# Altium footprint library Mainboard.PcbLib: 37 footprints (part 2 of 3)
Each footprint in its own frame and in the unit in brackets; x right, y up, seen from the top. Pads: shape width x height; smd on the part's side, far side on the other; paste and mask are expansions set on the pad; w line width, h text height; cw(c..) or ccw(c..) is an arc to the next point about the centre after c.
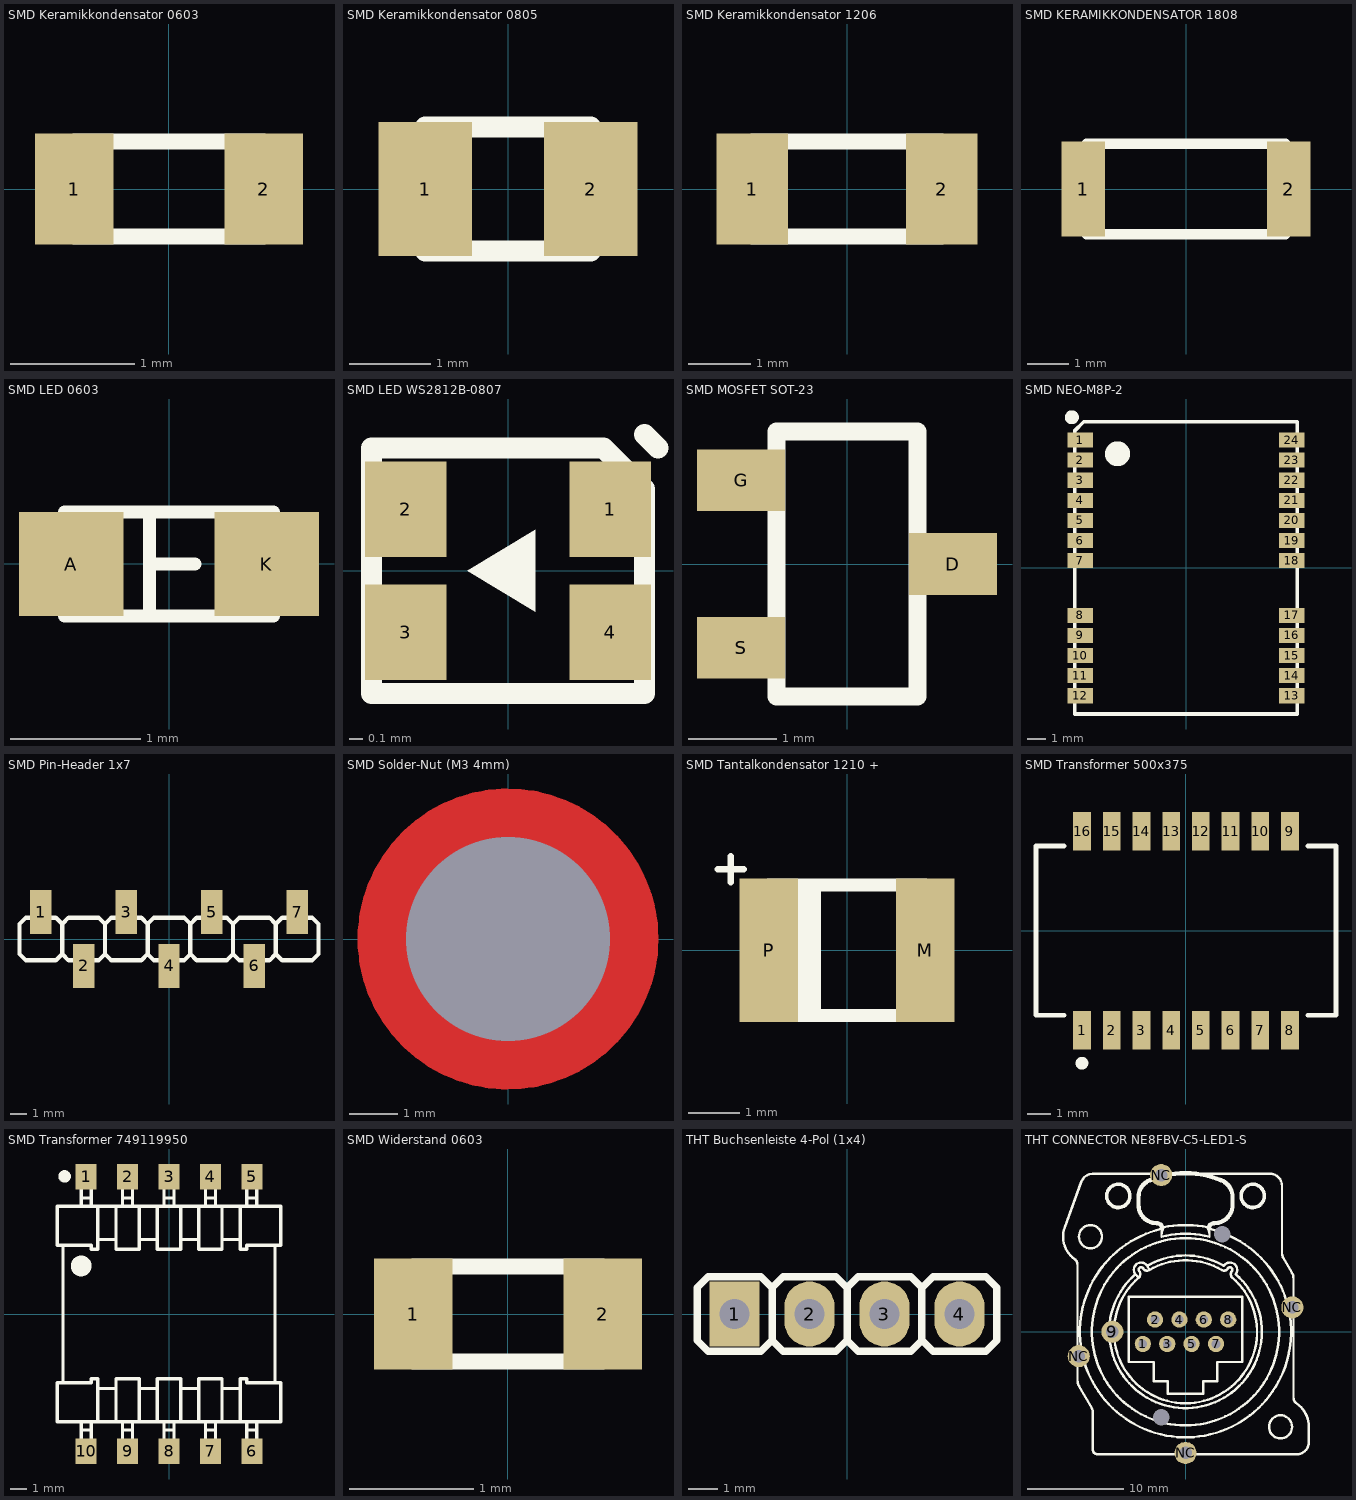
[diagram p1: the footprints below, top view; thin cyan lines are the x and y axes]

## SMD Keramikkondensator 0603 [mil]
height 66.93
pads (2):
  rect 25x35 smd: 1(-30,0) 2(30,0)
Top Overlay:
  lines w5: -30,-15 30,-15 30,15 -30,15 -30,-15
3D body "User Library-0603_Cap.STEP": height 31.69, standoff 0, extent -31.49,-15.74 31.5,15.75

## SMD Keramikkondensator 0805 [mil]
height 66.93
pads (2):
  rect 45x65 smd: 1(-40,0) 2(40,0)
Top Overlay:
  lines w10: -40,-30 -40,30 40,30 40,-30 -40,-30
3D body "User Library-0805 SMD Capacitor.step": height 30.79, standoff 0, extent -39.36,-24.6 39.38,24.61

## SMD Keramikkondensator 1206 [mil]
pads (2):
  rect 45x70 smd: 1(-60,0) 2(60,0)
Top Overlay:
  lines w10: -60,-30 -60,30 60,30 60,-30 -60,-30
3D body "User Library-1206 SMD Capacitor.step": height 39.45, standoff 0, extent -62.98,-31.49 63,31.51

## SMD KERAMIKKONDENSATOR 1808 [mm]
pads (2):
  rect 1.05x2.3 smd: 1(-2.5,0) 2(2.5,0)
Top Overlay:
  lines w0.254: -2.413,-1.1 -2.413,1.1 2.413,1.1 2.413,-1.1 -2.413,-1.1
3D body "User Library-Ceramic_Capacitor_1808_h50mil.STEP": height 1.26, standoff 0.01, extent -2.25,-1 2.25,1

## SMD LED 0603 [mm] "SMD_LED_RED"
height 8.65
pads (2):
  rect 0.8x0.8 smd: A(-0.75,0) K(0.75,0)
Top Overlay:
  lines w0.1: -0.15,-0.4 -0.15,0.4 ; -0.15,0 0.2,0 ; -0.8,-0.4 0.8,-0.4 0.8,0.4 -0.8,0.4 -0.8,-0.4
3D body "User Library-LED SMD0603.step": height 0.68, standoff 0, extent -0.808,-0.368 0.842,0.357

## SMD LED WS2812B-0807 [mm] "SMD_LED_RED"
height 8.65
pads (4):
  rect 0.6x0.7 smd: 1(0.75,0.45) 2(-0.75,0.45) 3(-0.75,-0.45) 4(0.75,-0.45)
Top Overlay:
  region: 0.2,0.3 -0.3,0 0.2,-0.3
  lines w0.152: 1,1 1.1,0.9 ; -1,-0.9 1,-0.9 1,0.6 0.7,0.9 -1,0.9 -1,-0.9
3D body "WS2812-0807.SLDPRT": height 0.85, standoff 0.01, extent -1,-0.9 1,0.9

## SMD MOSFET SOT-23 [mm]
pads (3):
  rect 1x0.7 smd: D(1.2,0) G(-1.2,0.95) S(-1.2,-0.95)
Top Overlay:
  lines w0.203: -0.8,-1.5 -0.8,1.5 0.8,1.5 0.8,-1.5 -0.8,-1.5
3D body "CircuitWorks-SOT-23.step": height 1.1, standoff 0, extent -1.301,-1.5 1.199,1.5

## SMD NEO-M8P-2 [mm] "QFN, 48-Leads, Body 7x7mm, Pitch 0.5mm, IPC Medium Density"
height 0.9
pads (24):
  rect 1.4x0.825 smd: 1(-5.8,7) 2(-5.8,5.9) 3(-5.8,4.8) 4(-5.8,3.7) 5(-5.8,2.6) 6(-5.8,1.5) 7(-5.8,0.4) 8(-5.8,-2.6) 9(-5.8,-3.7) 10(-5.8,-4.8) 11(-5.8,-5.9) 12(-5.8,-7) 13(5.8,-7) 14(5.8,-5.9) 15(5.8,-4.8) 16(5.8,-3.7) 17(5.8,-2.6) 18(5.8,0.4) 19(5.8,1.5) 20(5.8,2.6) 21(5.8,3.7) 22(5.8,4.8) 23(5.8,5.9) 24(5.8,7)
Top Overlay:
  circle w0.4: c-6.25,8.25 r0.18
  circle w1: c-3.75,6.25 r0.18
  lines w0.203: -6.1,-8 6.1,-8 6.1,8 -5.6,8 -6.1,7.5 -6.1,-8
3D body "NEO-M8P-2.x_t": height 2.6, standoff 0, extent -6.1,-8 6.1,8

## SMD Pin-Header 1x7 [mm]
height 6
pads (7):
  rect 1.27x2.6 smd: 1(-7.62,1.6) 2(-5.08,-1.6) 3(-2.54,1.6) 4(0,-1.6) 5(2.54,1.6) 6(5.08,-1.6) 7(7.62,1.6)
Top Overlay:
  lines w0.254: -8.89,-0.889 -8.89,-0.762 -8.89,0.889 ; -8.89,-0.889 -8.509,-1.27 -6.731,-1.27 -6.35,-0.889 ; -8.89,-0.889 -8.89,0.889 ; -8.89,0.889 -8.509,1.27 -6.731,1.27 -6.35,0.889 ; -6.35,-0.889 -6.35,-0.762 -6.35,0.889 ; -6.35,-0.889 -5.969,-1.27 -4.191,-1.27 -3.81,-0.889 ; -6.35,-0.889 -6.35,0.889 ; -6.35,0.889 -5.969,1.27 -4.191,1.27 -3.81,0.889 ; -3.81,-0.889 -3.81,-0.762 -3.81,0.889 ; -3.81,-0.889 -3.429,-1.27 -1.651,-1.27 -1.27,-0.889 ; -3.81,-0.889 -3.81,0.889 ; -3.81,0.889 -3.429,1.27 -1.651,1.27 -1.27,0.889 ; -1.27,-0.889 -1.27,-0.762 -1.27,0.889 ; -1.27,-0.889 -0.889,-1.27 0.889,-1.27 1.27,-0.889 ; -1.27,-0.889 -1.27,0.889 ; -1.27,0.889 -0.889,1.27 0.889,1.27 1.27,0.889 ; 1.27,-0.889 1.651,-1.27 3.429,-1.27 3.81,-0.889 ; 1.27,-0.889 1.27,-0.762 1.27,0.889 ; 1.27,-0.889 1.27,0.889 ; 1.27,0.889 1.651,1.27 3.429,1.27 3.81,0.889 ; 3.81,-0.889 3.81,-0.762 3.81,0.889 ; 3.81,-0.889 4.191,-1.27 5.969,-1.27 6.35,-0.889 ; 3.81,-0.889 3.81,0.889 ; 3.81,0.889 4.191,1.27 5.969,1.27 6.35,0.889 ; 6.35,-0.889 6.35,-0.762 6.35,0.889 ; 6.35,-0.889 6.731,-1.27 8.509,-1.27 8.89,-0.889 ; 6.35,-0.889 6.35,0.889 ; 6.35,0.889 6.731,1.27 8.509,1.27 8.89,0.889 ; 8.89,-0.889 8.89,-0.762 8.89,0.889 ; 8.89,-0.889 8.89,0.889
3D body "basis smd pinheader1x7.x_t": height 10.16, standoff 0, extent -8.89,-2.54 8.89,2.54

## SMD Solder-Nut (M3 4mm) [mm]
pads (1):
  round 0 hole 4.22: 1(0,0)
Top Layer:
  circle w1.02: c0,0 r2.61
Top Paste:
  region: 1.989,-0.704 2.042,-0.533 2.102,-0.179 2.102,0.179 2.042,0.533 1.989,0.704 2.914,1.087 3.011,0.826 3.11,0.278 3.11,-0.278 3.011,-0.826 2.914,-1.087
  region: 0.908,1.904 1.067,1.82 1.36,1.613 1.613,1.36 1.82,1.067 1.904,0.908 2.829,1.291 2.714,1.545 2.396,2.002 2.002,2.396 1.545,2.714 1.291,2.829
  region: -0.704,-1.989 -0.533,-2.042 -0.179,-2.102 0.179,-2.102 0.533,-2.042 0.704,-1.989 1.087,-2.914 0.826,-3.011 0.278,-3.11 -0.278,-3.11 -0.826,-3.011 -1.087,-2.914
  region: 1.904,-0.908 1.82,-1.067 1.613,-1.36 1.36,-1.613 1.067,-1.82 0.908,-1.904 1.291,-2.829 1.545,-2.714 2.002,-2.396 2.396,-2.002 2.714,-1.545 2.829,-1.291
  region: -1.989,0.704 -2.042,0.533 -2.102,0.179 -2.102,-0.179 -2.042,-0.533 -1.989,-0.704 -2.914,-1.087 -3.011,-0.826 -3.11,-0.278 -3.11,0.278 -3.011,0.826 -2.914,1.087
  region: -0.908,-1.904 -1.067,-1.82 -1.36,-1.613 -1.613,-1.36 -1.82,-1.067 -1.904,-0.908 -2.829,-1.291 -2.714,-1.545 -2.396,-2.002 -2.002,-2.396 -1.545,-2.714 -1.291,-2.829
  region: 0.704,1.989 0.533,2.042 0.179,2.102 -0.179,2.102 -0.533,2.042 -0.704,1.989 -1.087,2.914 -0.826,3.011 -0.278,3.11 0.278,3.11 0.826,3.011 1.087,2.914
  region: -1.904,0.908 -1.82,1.067 -1.613,1.36 -1.36,1.613 -1.067,1.82 -0.908,1.904 -1.291,2.829 -1.545,2.714 -2.002,2.396 -2.396,2.002 -2.714,1.545 -2.829,1.291
Top Solder:
  circle w1.102: c0,0 r2.661
3D body "SMTSO3040CTJ.x_t": height 4, standoff -1.53, extent -2.606,-2.606 2.606,2.606

## SMD Tantalkondensator 1210 + [mil]
pads (2):
  rect 45x110 smd: M(60,0) P(-60,0)
Top Overlay:
  rectangle: -60,-50 -20,50
  lines w5: -99,62 -79,62 ; -89,52 -89,72
  lines w10: -60,-50 -60,50 60,50 60,-50 -60,-50
3D body "User Library-AVX_BCASE.x_b": height 79.92, standoff 0, extent -72.83,-57.67 72.84,57.68

## SMD Transformer 500x375 [mm]
height 1.7
pads (16):
  rect 0.76x1.65 smd: 1(-4.445,-4.255) 2(-3.175,-4.255) 3(-1.905,-4.255) 4(-0.635,-4.255) 5(0.635,-4.255) 6(1.905,-4.255) 7(3.175,-4.255) 8(4.445,-4.255) 9(4.445,4.255) 10(3.175,4.255) 11(1.905,4.255) 12(0.635,4.255) 13(-0.635,4.255) 14(-1.905,4.255) 15(-3.175,4.255) 16(-4.445,4.255)
Top Overlay:
  circle w0.3: c-4.45,-5.67 r0.125
  lines w0.2: -5.2,-3.62 -6.415,-3.62 -6.415,3.62 -5.2,3.62 ; 5.2,-3.62 6.415,-3.62 6.415,3.62 5.2,3.62
3D body "Trans_Pulse_Electronics_Corporation_H1102NL_eec.STEP": height 0.25, standoff 0, extent -6.515,-5.18 6.515,5.18

## SMD Transformer 749119950 [mm]
height 1.7
pads (10):
  rect 1.27x1.55 smd: 1(-5,8.275) 2(-2.5,8.275) 3(0,8.275) 4(2.5,8.275) 5(5,8.275) 6(5,-8.275) 7(2.5,-8.275) 8(0,-8.275) 9(-2.5,-8.275) 10(-5,-8.275)
Top Overlay:
  circle w0.5: c-6.3,8.3 r0.125
  circle w1: c-5.3,2.9 r0.125
  lines w0.2: -6.4,-4.1 -6.4,0 -6.4,4.1 ; -5.3,-7.7 -4.7,-7.7 ; -5.3,-7 -4.7,-7 ; -5.3,-6.6 -5.3,-8.8 -4.7,-8.8 -4.7,-6.6 ; -5.3,6.6 -5.3,8.8 -4.7,8.8 -4.7,6.6 ; -5.3,7 -4.7,7 ; -5.3,7.7 -4.7,7.7 ; -4.3,-6.5 -4.3,-3.9 -4.7,-3.9 -4.7,-4.15 -6.75,-4.15 -6.75,-6.5 0,-6.5 6.75,-6.5 6.75,-4.15 4.7,-4.15 4.7,-3.9 4.3,-3.9 4.3,-6.5 ; -4.3,-4.5 -3.2,-4.5 ; -4.3,4.5 -3.2,4.5 ; -4.3,6.5 -4.3,3.9 -4.7,3.9 -4.7,4.15 -6.75,4.15 -6.75,6.5 0,6.5 6.75,6.5 6.75,4.15 4.7,4.15 4.7,3.9 4.3,3.9 4.3,6.5 ; -3.2,-6.5 -3.2,-3.9 -1.8,-3.9 -1.8,-6.5 ; -3.2,6.5 -3.2,3.9 -1.8,3.9 -1.8,6.5 ; -2.8,-7.7 -2.2,-7.7 ; -2.8,-7 -2.2,-7 ; -2.8,-6.6 -2.8,-8.8 -2.2,-8.8 -2.2,-6.6 ; -2.8,6.6 -2.8,8.8 -2.2,8.8 -2.2,6.6 ; -2.8,7 -2.2,7 ; -2.8,7.7 -2.2,7.7 ; -1.8,-4.5 -0.7,-4.5 ; -1.8,4.5 -0.7,4.5 ; -0.7,-6.5 -0.7,-3.9 0,-3.9 0.7,-3.9 0.7,-6.5 ; -0.7,6.5 -0.7,3.9 0,3.9 0.7,3.9 0.7,6.5 ; -0.3,-7.7 0,-7.7 0.3,-7.7 ; -0.3,-7 0,-7 0.3,-7 ; -0.3,-6.6 -0.3,-8.8 0,-8.8 0.3,-8.8 0.3,-6.6 ; -0.3,6.6 -0.3,8.8 0,8.8 0.3,8.8 0.3,6.6 ; -0.3,7 0,7 0.3,7 ; -0.3,7.7 0,7.7 0.3,7.7 ; 0.7,-4.5 1.8,-4.5 ; 0.7,4.5 1.8,4.5 ; 1.8,-6.5 1.8,-3.9 3.2,-3.9 3.2,-6.5 ; 1.8,6.5 1.8,3.9 3.2,3.9 3.2,6.5 ; 2.2,-7.7 2.8,-7.7 ; 2.2,-7 2.8,-7 ; 2.2,-6.6 2.2,-8.8 2.8,-8.8 2.8,-6.6 ; 2.2,6.6 2.2,8.8 2.8,8.8 2.8,6.6 ; 2.2,7 2.8,7 ; 2.2,7.7 2.8,7.7 ; 3.2,-4.5 4.3,-4.5 ; 3.2,4.5 4.3,4.5 ; 4.7,-7.7 5.3,-7.7 ; 4.7,-7 5.3,-7 ; 4.7,-6.6 4.7,-8.8 5.3,-8.8 5.3,-6.6 ; 4.7,6.6 4.7,8.8 5.3,8.8 5.3,6.6 ; 4.7,7 5.3,7 ; 4.7,7.7 5.3,7.7 ; 6.4,-4.1 6.4,0 6.4,4.1
3D body "749119933_Download_STP_WE-POE-EP13_rev1.x_t": height 12.52, standoff 0.02, extent -6.75,-8.875 6.75,8.875

## SMD Widerstand 0603 [mil]
height 66.93
pads (2):
  rect 25x35 smd: 1(-30,0) 2(30,0)
Top Overlay:
  lines w5: -30,-15 30,-15 30,15 -30,15 -30,-15
3D body "User Library-Panasonic0603.step": height 17.72, standoff 0, extent -31.5,-16.14 31.5,16.14

## THT Buchsenleiste 4-Pol (1x4) [mm]
height 6
pads (4):
  rect 1.7x2.2 hole 1: 1(-3.81,0)
  oval 1.7x2.2 hole 1: 2(-1.27,0) 3(1.27,0) 4(3.81,0)
Top Overlay:
  lines w0.254: -5.08,-0.889 -5.08,-0.762 -5.08,0.889 ; -5.08,-0.889 -4.699,-1.27 -2.921,-1.27 -2.54,-0.889 ; -5.08,-0.889 -5.08,0.889 ; -5.08,0.889 -4.699,1.27 -2.921,1.27 -2.54,0.889 ; -2.54,-0.889 -2.54,-0.762 -2.54,0.889 ; -2.54,-0.889 -2.159,-1.27 -0.381,-1.27 0,-0.889 ; -2.54,-0.889 -2.54,0.889 ; -2.54,0.889 -2.159,1.27 -0.381,1.27 0,0.889 ; 0,-0.889 0,-0.762 0,0.889 ; 0,-0.889 0.381,-1.27 2.159,-1.27 2.54,-0.889 ; 0,-0.889 0,0.889 ; 0,0.889 0.381,1.27 2.159,1.27 2.54,0.889 ; 2.54,-0.889 2.54,-0.762 2.54,0.889 ; 2.54,-0.889 2.921,-1.27 4.699,-1.27 5.08,-0.889 ; 2.54,-0.889 2.54,0.889 ; 2.54,0.889 2.921,1.27 4.699,1.27 5.08,0.889 ; 5.08,-0.889 5.08,-0.762 5.08,0.889 ; 5.08,-0.889 5.08,0.889
3D body "User Library-ZL262-4SG.step": height 8.4, standoff -3.15, extent -5.08,-1.25 5.08,1.25

## THT CONNECTOR NE8FBV-C5-LED1-S [mm]
pads (15):
  round 1.7 hole 0.9: 1(-4.445,-1.27) 2(-3.175,1.27) 3(-1.905,-1.27) 4(-0.635,1.27) 5(0.635,-1.27) 6(1.905,1.27) 7(3.175,-1.27) 8(4.445,1.27)
  round 2.3 hole 1.3: 9(-7.62,0) NC(-11.125,-2.54) NC(-2.54,16.325) NC(0,-12.625) NC(11.125,2.54)
  round 0 hole 1.7 unplated: NC(-2.54,-8.89) NC(3.81,10.16)
Top Overlay:
  drawing of 1006 lines, arcs and shapes, not listed
3D body "d-ne8fbv-c5-led1-s.x_t": height 30.85, standoff -3.45, extent -12.748,-13.225 12.85,16.925